# Altium footprint library Connectors_rus.PcbLib: 53 footprints (part 2 of 4)
Each footprint in its own frame and in the unit in brackets; x right, y up, seen from the top. Pads: shape width x height; smd on the part's side, far side on the other; paste and mask are expansions set on the pad; w line width, h text height; cw(c..) or ccw(c..) is an arc to the next point about the centre after c.
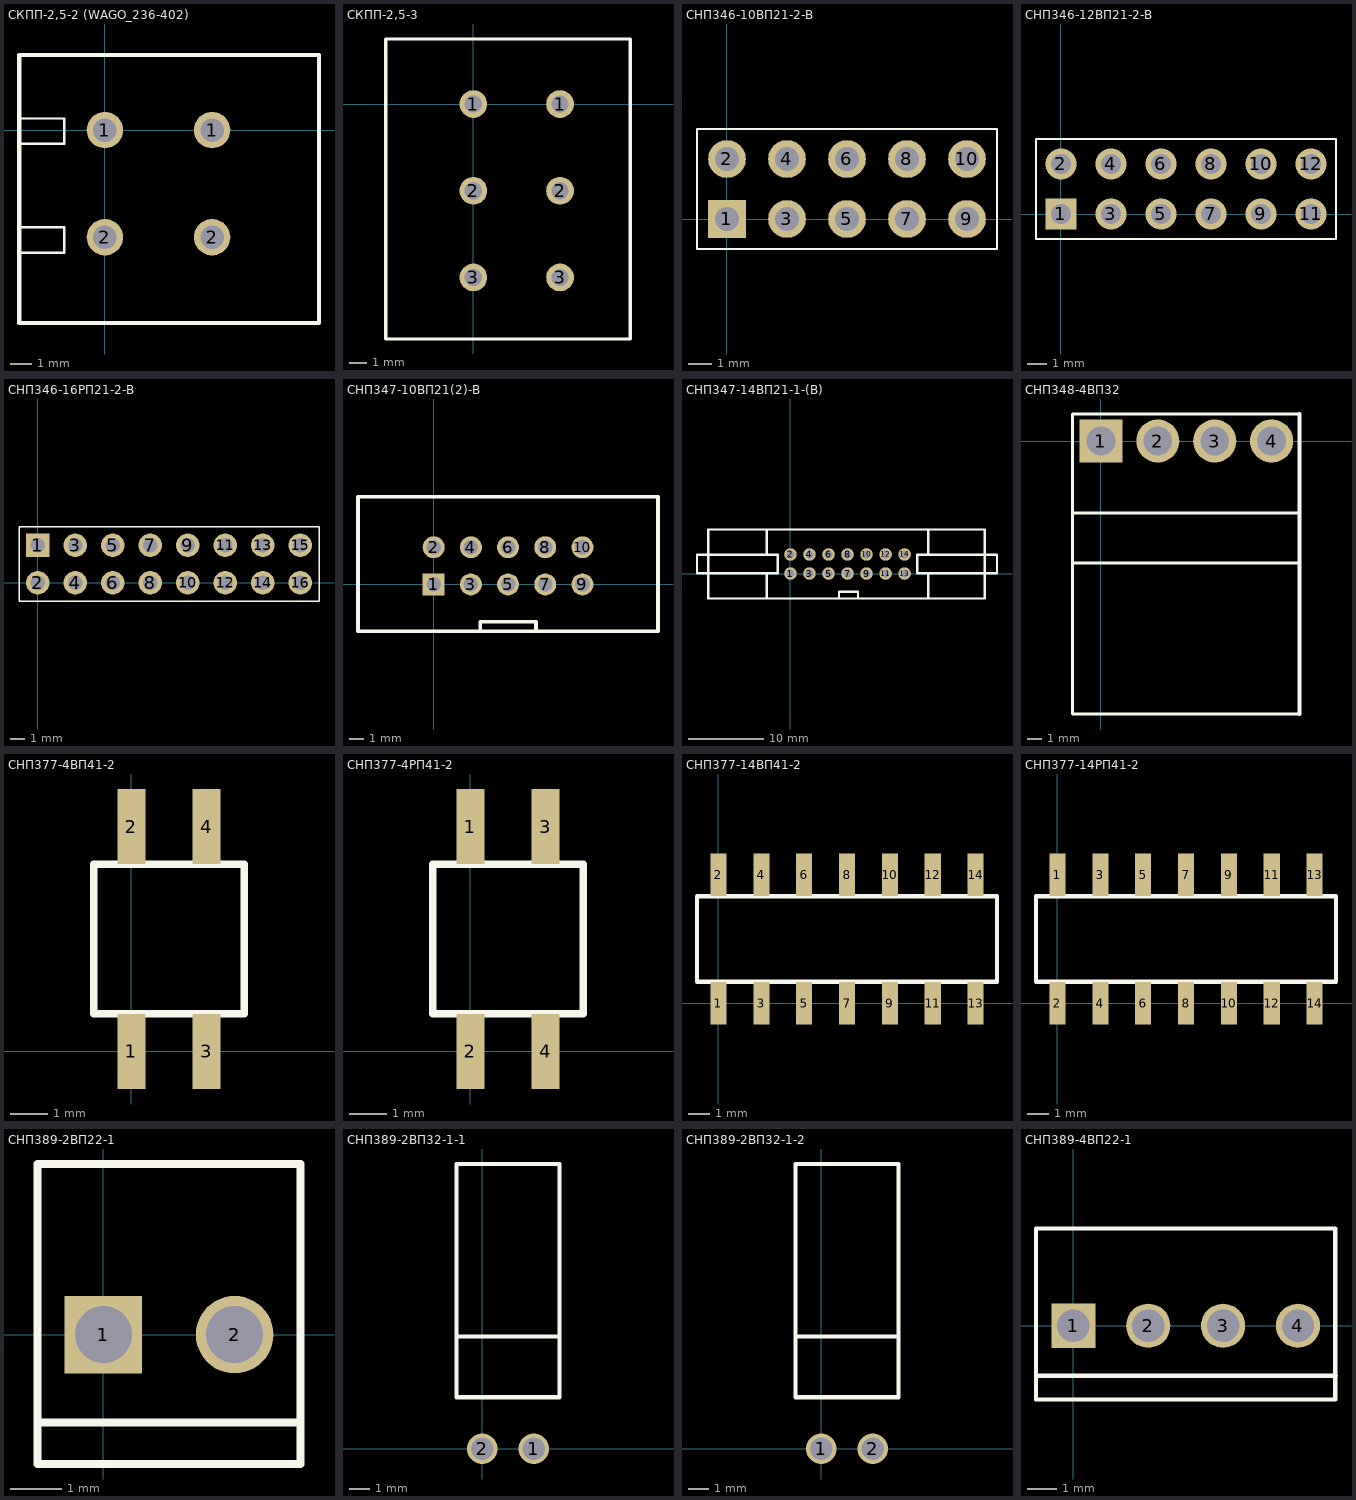
[diagram p1: the footprints below, top view; thin cyan lines are the x and y axes]

## СКПП-2,5-2 (WAGO_236-402) [mm]
pads (4):
  round 1.7 hole 1.1: 1(0,0) 1(5,0) 2(0,-5) 2(5,-5)
Top Overlay:
  lines w0.11: -4.01,-5.72 -1.89,-5.72 -1.89,-4.54 -3.99,-4.54 ; -4.01,-0.64 -1.89,-0.64 -1.89,0.54 -3.99,0.54 ; -4.01,0.75 -4,0.75
  lines w0.2: -4,3.48 -4,0.75 -4,-9 9.99,-9 9.99,3.5 -4,3.5
3D body "236-402.stp": height 12.71, standoff -4, extent -4.09,-8.77 9.995,3.53

## СКПП-2,5-3 [mm]
height 17
pads (6):
  round 1.6 hole 1: 1(0,0) 1(5,0) 2(0,-5) 2(5,-5) 3(0,-10) 3(5,-10)
Top Overlay:
  lines w0.2: -5.043,-13.55 9.043,-13.55 9.043,3.75 -5.043,3.75 -5.043,-13.55
3D body "236-743_999-950.stp": height 12.71, standoff -4, extent -5.043,-3.55 9.043,3.75
3D body "236-743_999-950.stp": height 12.71, standoff -4, extent -5.043,-8.55 9.043,-1.25
3D body "236-743_999-950.stp": height 12.71, standoff -4, extent -5.043,-13.55 9.043,-6.25

## СНП346-10ВП21-2-В [mm]
pads (10):
  rect 1.6x1.6 hole 1: 1(0,0)
  round 1.6 hole 1: 2(0,2.54) 3(2.54,0) 4(2.54,2.54) 5(5.08,0) 6(5.08,2.54) 7(7.62,0) 8(7.62,2.54) 9(10.16,0) 10(10.16,2.54)
Top Overlay:
  lines w0.1: 11.43,-1.27 11.43,1.27 ; 11.43,-1.27 8.89,-1.27 6.35,-1.27 3.81,-1.27 1.27,-1.27 -1.27,-1.27 -1.27,1.27 -1.27,3.81 1.27,3.81 3.81,3.81 6.35,3.81 8.89,3.81 11.43,3.81 ; 11.43,-1.27 11.43,1.27 ; 11.43,1.27 11.43,3.81 ; 11.43,1.27 11.43,3.81
3D body: height 8, standoff -2, extent -0.4,-0.399 0.397,0.399
3D body: height 2, standoff 0, extent -1.27,-1.27 1.27,1.27
3D body: height 2, standoff 0, extent 1.27,-1.27 3.81,1.27
3D body: height 8, standoff -2, extent 2.14,-0.399 2.937,0.399
3D body: height 2, standoff 0, extent 1.27,1.27 3.81,3.81
3D body: height 8, standoff -2, extent 2.14,2.141 2.937,2.939
3D body: height 2, standoff 0, extent -1.27,1.27 1.27,3.81
3D body: height 8, standoff -2, extent -0.4,2.141 0.397,2.939
3D body: height 2, standoff 0, extent 3.81,-1.27 6.35,1.27
3D body: height 8, standoff -2, extent 4.68,-0.399 5.477,0.399
3D body: height 2, standoff 0, extent 3.81,1.27 6.35,3.81
3D body: height 8, standoff -2, extent 4.68,2.141 5.477,2.939
3D body: height 2, standoff 0, extent 6.35,-1.27 8.89,1.27
3D body: height 8, standoff -2, extent 7.22,-0.399 8.017,0.399
3D body: height 2, standoff 0, extent 6.35,1.27 8.89,3.81
3D body: height 8, standoff -2, extent 7.22,2.141 8.017,2.939
3D body: height 2, standoff 0, extent 8.89,-1.27 11.43,1.27
3D body: height 8, standoff -2, extent 9.76,-0.399 10.557,0.399
3D body: height 2, standoff 0, extent 8.89,1.27 11.43,3.81
3D body: height 8, standoff -2, extent 9.76,2.141 10.557,2.939

## СНП346-12ВП21-2-В [mm]
pads (12):
  rect 1.6x1.6 hole 1: 1(0,0)
  round 1.6 hole 1: 2(0,2.54) 3(2.54,0) 4(2.54,2.54) 5(5.08,0) 6(5.08,2.54) 7(7.62,0) 8(7.62,2.54) 9(10.16,0) 10(10.16,2.54) 11(12.7,0) 12(12.7,2.54)
Top Overlay:
  lines w0.1: 13.97,-1.27 13.97,1.27 ; 13.97,-1.27 11.43,-1.27 8.89,-1.27 6.35,-1.27 3.81,-1.27 1.27,-1.27 -1.27,-1.27 -1.27,1.27 -1.27,3.81 1.27,3.81 3.81,3.81 6.35,3.81 8.89,3.81 11.43,3.81 13.97,3.81 ; 13.97,-1.27 13.97,1.27 ; 13.97,1.27 13.97,3.81 ; 13.97,1.27 13.97,3.81
3D body: height 8, standoff -2, extent -0.4,-0.399 0.397,0.399
3D body: height 2, standoff 0, extent -1.27,-1.27 1.27,1.27
3D body: height 2, standoff 0, extent 1.27,-1.27 3.81,1.27
3D body: height 8, standoff -2, extent 2.14,-0.399 2.937,0.399
3D body: height 2, standoff 0, extent 1.27,1.27 3.81,3.81
3D body: height 8, standoff -2, extent 2.14,2.141 2.937,2.939
3D body: height 2, standoff 0, extent -1.27,1.27 1.27,3.81
3D body: height 8, standoff -2, extent -0.4,2.141 0.397,2.939
3D body: height 2, standoff 0, extent 3.81,-1.27 6.35,1.27
3D body: height 8, standoff -2, extent 4.68,-0.399 5.477,0.399
3D body: height 2, standoff 0, extent 3.81,1.27 6.35,3.81
3D body: height 8, standoff -2, extent 4.68,2.141 5.477,2.939
3D body: height 2, standoff 0, extent 6.35,-1.27 8.89,1.27
3D body: height 8, standoff -2, extent 7.22,-0.399 8.017,0.399
3D body: height 2, standoff 0, extent 6.35,1.27 8.89,3.81
3D body: height 8, standoff -2, extent 7.22,2.141 8.017,2.939
3D body: height 2, standoff 0, extent 8.89,-1.27 11.43,1.27
3D body: height 8, standoff -2, extent 9.76,-0.399 10.557,0.399
3D body: height 2, standoff 0, extent 8.89,1.27 11.43,3.81
3D body: height 8, standoff -2, extent 9.76,2.141 10.557,2.939
3D body: height 2, standoff 0, extent 11.43,-1.27 13.97,1.27
3D body: height 8, standoff -2, extent 12.3,-0.399 13.097,0.399
3D body: height 2, standoff 0, extent 11.43,1.27 13.97,3.81
3D body: height 8, standoff -2, extent 12.3,2.141 13.097,2.939

## СНП346-16РП21-2-В [mm]
pads (16):
  rect 1.6x1.6 hole 1: 1(0,2.54)
  round 1.6 hole 1: 2(0,0) 3(2.54,2.54) 4(2.54,0) 5(5.08,2.54) 6(5.08,0) 7(7.62,2.54) 8(7.62,0) 9(10.16,2.54) 10(10.16,0) 11(12.7,2.54) 12(12.7,0) 13(15.24,2.54) 14(15.24,0) 15(17.78,2.54) 16(17.78,0)
Top Overlay:
  lines w0.1: 19.05,-1.27 19.05,1.27 ; 19.05,-1.27 16.51,-1.27 13.97,-1.27 11.43,-1.27 8.89,-1.27 6.35,-1.27 3.81,-1.27 1.27,-1.27 -1.27,-1.27 -1.27,1.27 -1.27,3.81 1.27,3.81 3.81,3.81 6.35,3.81 8.89,3.81 11.43,3.81 13.97,3.81 16.51,3.81 19.05,3.81 ; 19.05,-1.27 19.05,1.27 ; 19.05,1.27 19.05,3.81 ; 19.05,1.27 19.05,3.81
3D body "User Library-PBS-01.step": height 8.4, standoff -3.2, extent 8.89,-1.27 11.43,1.27
3D body "User Library-PBS-01.step": height 8.4, standoff -3.2, extent 11.43,-1.27 13.97,1.27
3D body "User Library-PBS-01.step": height 8.4, standoff -3.2, extent 8.89,1.27 11.43,3.81
3D body "User Library-PBS-01.step": height 8.4, standoff -3.2, extent 11.43,1.27 13.97,3.81
3D body "User Library-PBS-01.step": height 8.4, standoff -3.2, extent 16.51,1.27 19.05,3.81
3D body "User Library-PBS-01.step": height 8.4, standoff -3.2, extent 13.97,1.27 16.51,3.81
3D body "User Library-PBS-01.step": height 8.4, standoff -3.2, extent 16.51,-1.27 19.05,1.27
3D body "User Library-PBS-01.step": height 8.4, standoff -3.2, extent 13.97,-1.27 16.51,1.27
3D body "User Library-PBS-01.step": height 8.4, standoff -3.2, extent -1.27,-1.27 1.27,1.27
3D body "User Library-PBS-01.step": height 8.4, standoff -3.2, extent 1.27,-1.27 3.81,1.27
3D body "User Library-PBS-01.step": height 8.4, standoff -3.2, extent -1.27,1.27 1.27,3.81
3D body "User Library-PBS-01.step": height 8.4, standoff -3.2, extent 1.27,1.27 3.81,3.81
3D body "User Library-PBS-01.step": height 8.4, standoff -3.2, extent 6.35,1.27 8.89,3.81
3D body "User Library-PBS-01.step": height 8.4, standoff -3.2, extent 3.81,1.27 6.35,3.81
3D body "User Library-PBS-01.step": height 8.4, standoff -3.2, extent 6.35,-1.27 8.89,1.27
3D body "User Library-PBS-01.step": height 8.4, standoff -3.2, extent 3.81,-1.27 6.35,1.27

## СНП347-10ВП21(2)-В [mm]
pads (10):
  rect 1.5x1.5 hole 1: 1(0,0)
  round 1.5 hole 1: 2(0,2.54) 3(2.54,0) 4(2.54,2.54) 5(5.08,0) 6(5.08,2.54) 7(7.62,0) 8(7.62,2.54) 9(10.16,0) 10(10.16,2.54)
Top Overlay:
  lines w0.254: 3.175,-3.14 3.175,-2.555 6.985,-2.555 6.985,-3.11 ; -5.17,-3.19 -5.17,5.98 15.32,5.98 15.32,-3.19 -5.17,-3.19
3D body "User Library-BH-10__64.step": height 9.1, standoff -3, extent -5.13,-3.35 15.37,5.95

## СНП347-14ВП21-1-(В) [mm] "Аналог IDCC-14MS"
pads (14):
  round 1.67 hole 1.07: 1(0,0) 2(0,2.54) 3(2.54,0) 4(2.54,2.54) 5(5.08,0) 6(5.08,2.54) 7(7.62,0) 8(7.62,2.54) 9(10.16,0) 10(10.16,2.54) 11(12.7,0) 12(12.7,2.54) 13(15.24,0) 14(15.24,2.54)
Top Overlay:
  lines w0.3: -3.15,-3.226 -3.15,0.051 ; -3.15,2.565 -3.15,5.842 ; 6.47,-3.26 6.47,-2.42 8.97,-2.42 ; 9.01,-3.3 9.01,-2.42 ; 18.39,-3.226 18.39,0.051 ; 18.39,2.565 18.39,5.842 ; -12.48,0.051 -12.48,2.515 -1.702,2.515 -1.702,0.051 -12.48,0.051 ; -10.99,-3.33 -10.99,5.87 25.95,5.87 25.95,-3.33 -10.99,-3.33 ; 16.942,0.051 16.942,2.515 27.58,2.515 27.58,0.051 16.942,0.051
3D body "3-1437049-3.stp": height 20.46, standoff -2.81, extent -12.66,-3.225 27.741,5.994

## СНП348-4ВП32 [mm]
pads (4):
  rect 3x3 hole 2: 1(0,0)
  round 3 hole 2: 2(3.96,0) 3(7.92,0) 4(11.88,0)
Top Overlay:
  lines w0.2: -1.98,-5 13.81,-5 ; -1.97,-8.5 13.82,-8.5 ; 13.823,-19 -1.98,-19 -1.98,1.88 13.823,1.88
  lines w0.254: 13.823,-19 13.823,0 13.823,1.88
3D body "User Library-PWL-4R.step": height 10.4, standoff -3.7, extent -1.99,-16.87 13.85,0.398

## СНП377-4ВП41-2 [mm]
pads (4):
  rect 0.75x2 smd: 1(0,0) 2(0,6) 3(2,0) 4(2,6)
Top Overlay:
  lines w0.2: -1,1 -1,5 3,5 3,1 -1,1
3D body: height 0.22, standoff 0, extent 1.68,-0.29 2.31,1
3D body: height 0.22, standoff 0, extent -0.32,-0.29 0.31,1
3D body: height 0.22, standoff 0, extent 1.69,5 2.32,6.29
3D body: height 0.22, standoff 0, extent -0.31,5 0.32,6.29
3D body: height 2.9, standoff 0, extent -1,0.99 3.08,4.99
3D body: height 6.9, standoff 0.4, extent -0.39,3.65 0.34,4.35
3D body: height 6.9, standoff 0.4, extent -0.39,1.64 0.34,2.34
3D body: height 6.9, standoff 0.4, extent 1.61,1.64 2.34,2.34
3D body: height 6.9, standoff 0.4, extent 1.61,3.65 2.34,4.35

## СНП377-4РП41-2 [mm]
pads (4):
  rect 0.75x2 smd: 1(0,6) 2(0,0) 3(2,6) 4(2,0)
Top Overlay:
  lines w0.2: 2.97,1 -1,1 -1,5 2.97,5 ; 3,1 3,5
3D body: height 4.6, standoff 0, extent -1.03,1 -0.39,5
3D body: height 4.6, standoff 0, extent 0.34,0.99 1.65,5
3D body: height 4.6, standoff 0, extent 2.35,1 3.02,5.01
3D body: height 4.6, standoff 0, extent -1,4.35 3,5
3D body: height 4.6, standoff 0, extent -0.98,2.35 3,3.65
3D body: height 4.6, standoff 0, extent -1,0.99 3.01,1.64
3D body: height 0.1, standoff 0, extent -1,0.99 3.04,4.99
3D body: height 0.22, standoff 0, extent -0.31,5 0.32,6.29
3D body: height 0.22, standoff 0, extent 1.69,5 2.32,6.29
3D body: height 0.22, standoff 0, extent -0.32,-0.29 0.31,1
3D body: height 0.22, standoff 0, extent 1.68,-0.29 2.31,1

## СНП377-14ВП41-2 [mm]
pads (14):
  rect 0.75x2 smd: 1(0,0) 2(0,6) 3(2,0) 4(2,6) 5(4,0) 6(4,6) 7(6,0) 8(6,6) 9(8,0) 10(8,6) 11(10,0) 12(10,6) 13(12,0) 14(12,6)
Top Overlay:
  lines w0.2: -1,1 -1,5 13,5 13,1 -1,1
3D body: height 0.22, standoff 0, extent 11.68,-0.29 12.31,1
3D body: height 0.22, standoff 0, extent 9.68,-0.29 10.31,1
3D body: height 0.22, standoff 0, extent 7.68,-0.29 8.31,1
3D body: height 0.22, standoff 0, extent 5.68,-0.29 6.31,1
3D body: height 0.22, standoff 0, extent 3.68,-0.29 4.31,1
3D body: height 0.22, standoff 0, extent 1.68,-0.29 2.31,1
3D body: height 0.22, standoff 0, extent -0.32,-0.29 0.31,1
3D body: height 0.22, standoff 0, extent 11.69,5 12.32,6.29
3D body: height 0.22, standoff 0, extent 9.69,5 10.32,6.29
3D body: height 0.22, standoff 0, extent 7.69,5 8.32,6.29
3D body: height 0.22, standoff 0, extent 5.69,5 6.32,6.29
3D body: height 0.22, standoff 0, extent 3.69,5 4.32,6.29
3D body: height 0.22, standoff 0, extent 1.69,5 2.32,6.29
3D body: height 0.22, standoff 0, extent -0.31,5 0.32,6.29
3D body: height 2.9, standoff 0, extent -1,0.99 13,4.99
3D body: height 6.9, standoff 0, extent -0.39,3.65 0.34,4.35
3D body: height 6.9, standoff 0, extent -0.39,1.64 0.34,2.34
3D body: height 6.9, standoff 0, extent 1.61,1.64 2.34,2.34
3D body: height 6.9, standoff 0, extent 1.61,3.65 2.34,4.35
3D body: height 6.9, standoff 0, extent 3.61,1.64 4.34,2.34
3D body: height 6.9, standoff 0, extent 3.61,3.65 4.34,4.35
3D body: height 6.9, standoff 0, extent 5.61,1.64 6.34,2.34
3D body: height 6.9, standoff 0, extent 5.61,3.65 6.34,4.35
3D body: height 6.9, standoff 0, extent 7.61,1.64 8.34,2.34
3D body: height 6.9, standoff 0, extent 7.61,3.65 8.34,4.35
3D body: height 6.9, standoff 0, extent 9.61,1.64 10.34,2.34
3D body: height 6.9, standoff 0, extent 9.61,3.65 10.34,4.35
3D body: height 6.9, standoff 0, extent 11.61,1.64 12.34,2.34
3D body: height 6.9, standoff 0, extent 11.61,3.65 12.34,4.35

## СНП377-14РП41-2 [mm]
pads (14):
  rect 0.75x2 smd: 1(0,6) 2(0,0) 3(2,6) 4(2,0) 5(4,6) 6(4,0) 7(6,6) 8(6,0) 9(8,6) 10(8,0) 11(10,6) 12(10,0) 13(12,6) 14(12,0)
Top Overlay:
  lines w0.2: -1,1 -1,5 13,5 13,1 -1,1
3D body: height 0.22, standoff 0, extent 11.68,-0.29 12.31,1
3D body: height 0.22, standoff 0, extent 9.68,-0.29 10.31,1
3D body: height 0.22, standoff 0, extent 7.68,-0.29 8.31,1
3D body: height 0.22, standoff 0, extent 5.68,-0.29 6.31,1
3D body: height 0.22, standoff 0, extent 3.68,-0.29 4.31,1
3D body: height 0.22, standoff 0, extent 1.68,-0.29 2.31,1
3D body: height 0.22, standoff 0, extent -0.32,-0.29 0.31,1
3D body: height 0.22, standoff 0, extent 11.69,5 12.32,6.29
3D body: height 0.22, standoff 0, extent 9.69,5 10.32,6.29
3D body: height 0.22, standoff 0, extent 7.69,5 8.32,6.29
3D body: height 0.22, standoff 0, extent 5.69,5 6.32,6.29
3D body: height 0.22, standoff 0, extent 3.69,5 4.32,6.29
3D body: height 0.22, standoff 0, extent 1.69,5 2.32,6.29
3D body: height 0.22, standoff 0, extent -0.31,5 0.32,6.29
3D body: height 0.1, standoff 0, extent -1,0.99 13,4.99
3D body: height 4.6, standoff 0, extent -1,0.99 13,1.64
3D body: height 4.6, standoff 0, extent -0.98,2.35 13,3.65
3D body: height 4.6, standoff 0, extent -1,4.35 13,5
3D body: height 4.6, standoff 0, extent 10.35,1 11.66,5.01
3D body: height 4.6, standoff 0, extent 8.35,1 9.66,5.01
3D body: height 4.6, standoff 0, extent 6.35,1 7.66,5.01
3D body: height 4.6, standoff 0, extent 4.35,1 5.66,5.01
3D body: height 4.6, standoff 0, extent 2.35,1 3.66,5.01
3D body: height 4.6, standoff 0, extent 0.34,0.99 1.65,5
3D body: height 4.6, standoff 0, extent 12.36,1 13,5
3D body: height 4.6, standoff 0, extent -1.03,1 -0.39,5

## СНП389-2ВП22-1 [mm]
pads (2):
  rect 1.5x1.5 hole 1.1: 1(0,0)
  round 1.5 hole 1.1: 2(2.54,0)
Top Overlay:
  lines w0.15: -1.27,-1.7 -1.27,-2.5 ; -1.25,-1.7 3.809,-1.7 ; -1.27,-2.5 3.81,-2.5 3.81,3.3 -1.27,3.3 -1.27,-2.5
3D body "User Library-WF-2.step": height 11.83, standoff -2.45, extent -1.346,-2.697 3.854,3.203

## СНП389-2ВП32-1-1 [mm]
pads (2):
  round 1.5 hole 1.1: 1(2.54,0) 2(0,0)
Top Overlay:
  lines w0.2: -1.26,11.5 -1.26,2.54 -1.26,14.04 3.8,14.04 3.8,11.49 3.8,2.54 ; -1.25,5.54 3.79,5.54 ; -1.23,2.54 3.79,2.54
3D body "User Library-WF-2R.step": height 5.8, standoff -3.4, extent -1.26,-0.33 3.82,12.87

## СНП389-2ВП32-1-2 [mm]
pads (2):
  round 1.5 hole 1.1: 1(0,0) 2(2.54,0)
Top Overlay:
  lines w0.2: -1.26,11.5 -1.26,2.54 -1.26,14.04 3.8,14.04 3.8,11.49 3.8,2.54 ; -1.25,5.54 3.79,5.54 ; -1.23,2.54 3.79,2.54
3D body "WF-2R.step": height 5.85, standoff -2.63, extent -1.27,-0.268 3.81,12.932

## СНП389-4ВП22-1 [mm]
pads (4):
  rect 1.5x1.5 hole 1.1: 1(0,0)
  round 1.5 hole 1.1: 2(2.54,0) 3(5.08,0) 4(7.62,0)
Top Overlay:
  lines w0.15: -1.27,-1.7 -1.27,-2.5 ; -1.25,-1.7 8.91,-1.7 ; -1.27,-2.5 8.89,-2.5 8.89,3.3 -1.27,3.3 -1.27,-2.5
3D body "User Library-WF-4.step": height 11.83, standoff -2.45, extent -1.262,-2.68 8.898,3.22